# Altium footprint library TH Connectors.PcbLib: 140 footprints (part 4 of 9)
Each footprint in its own frame and in the unit in brackets; x right, y up, seen from the top. Pads: shape width x height; smd on the part's side, far side on the other; paste and mask are expansions set on the pad; w line width, h text height; cw(c..) or ccw(c..) is an arc to the next point about the centre after c.
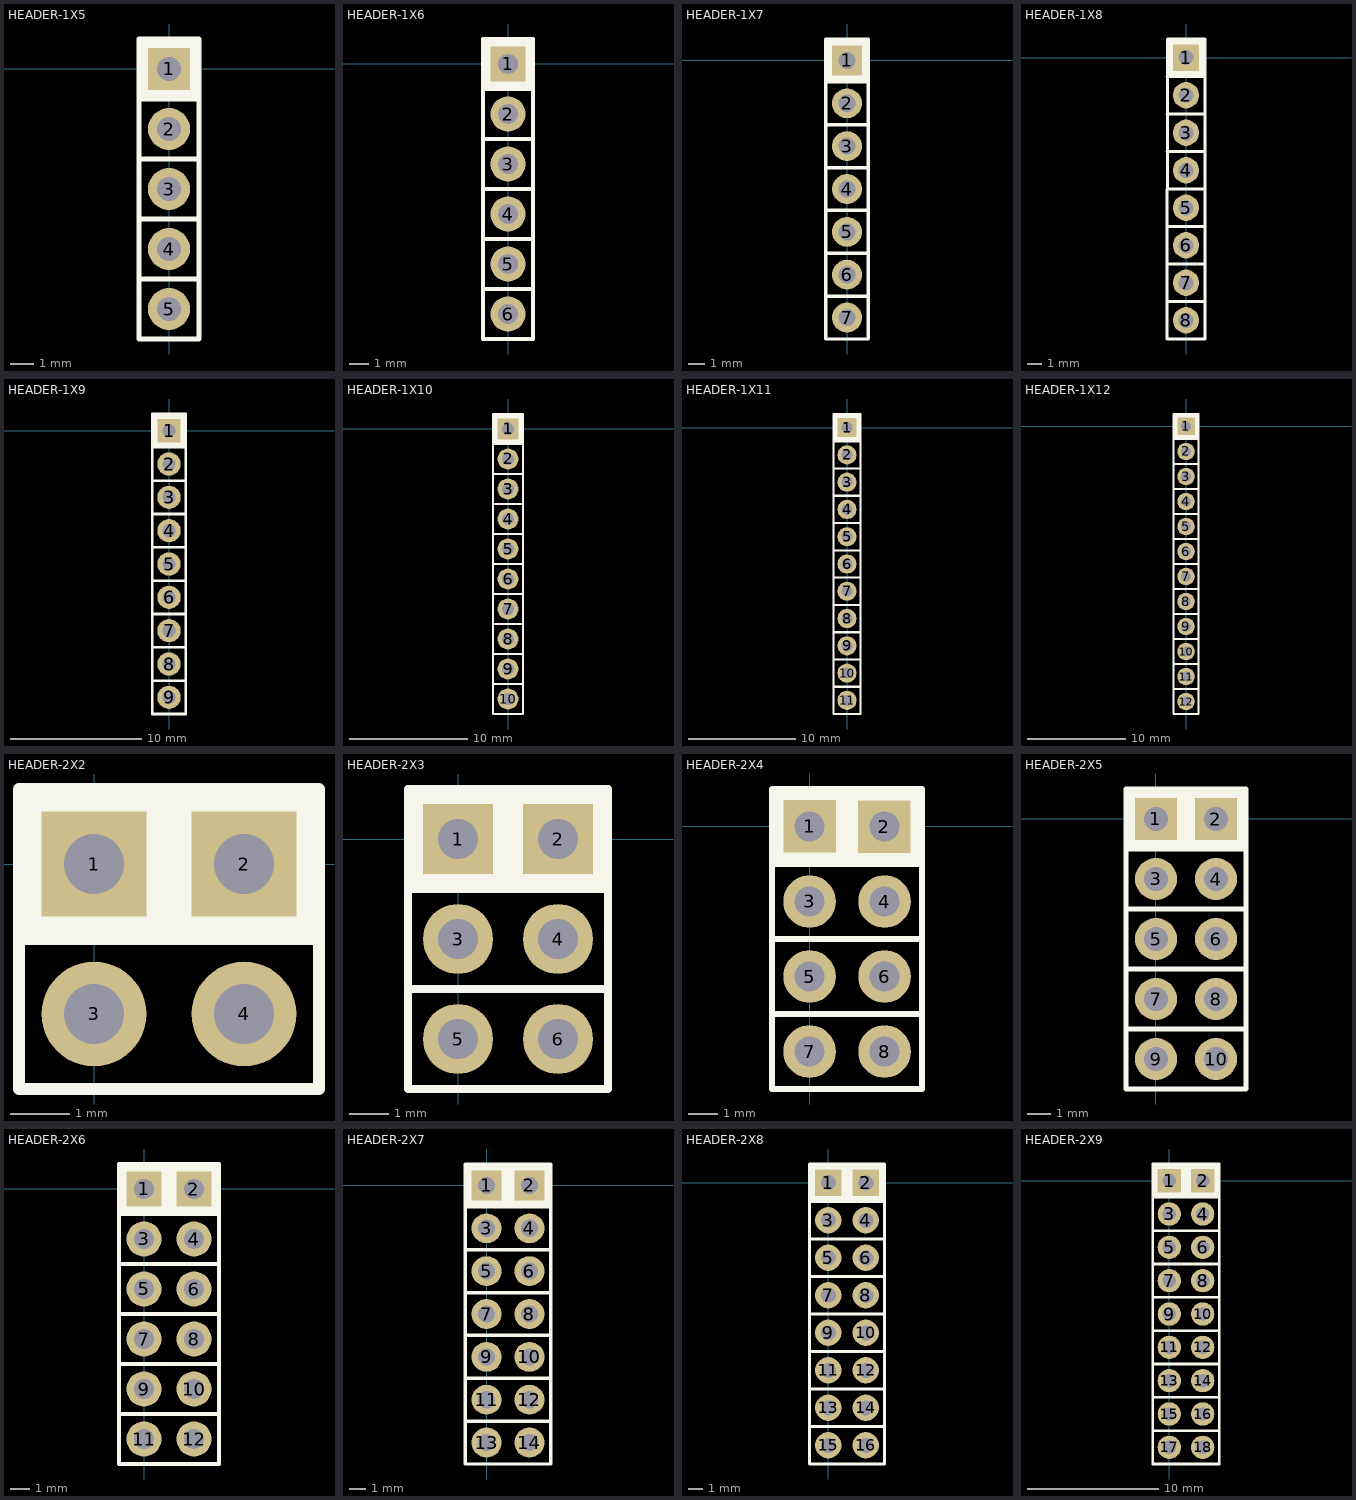
[diagram p3: the footprints below, top view; thin cyan lines are the x and y axes]

## HEADER-1X5 [mil]
pads (5):
  rect 70x70 hole 40: 1(0,0)
  round 70 hole 40: 2(0,-100) 3(0,-200) 4(0,-300) 5(0,-400)
Top Overlay:
  rectangle: -50,-49.62 50,50
  lines w8: -50,-350 50,-350 ; -50,-250 50,-250 ; -50,-150 50,-150 ; -50,-50 50,-50 ; -50,-450 -50,50 50,50 50,-450 -50,-450
3D body: height 470, standoff -120, extent -15,-215 15,-185
3D body: height 100, standoff 0, extent -50,-450 50,50
3D body: height 470, standoff -120, extent -15,-115 15,-85
3D body: height 470, standoff -120, extent -15,-15 15,15
3D body: height 470, standoff -120, extent -15,-315 15,-285
3D body: height 470, standoff -120, extent -15,-415 15,-385
3D body: height 101, standoff 100, extent -35,-35 35.5,35

## HEADER-1X6 [mil]
pads (6):
  rect 70x70 hole 40: 1(0,0)
  round 70 hole 40: 2(0,-100) 3(0,-200) 4(0,-300) 5(0,-400) 6(0,-500)
Top Overlay:
  rectangle: -50,-49.62 50,50
  lines w8: -50,-250 50,-250 ; -50,-150 50,-150 ; -50,-50 50,-50 ; -50,-550 50,-550 ; -50,-550 -50,50 50,50 50,-550 ; -50,-550 50,-550 ; -50,-550 50,-550 ; -50,-450 50,-450 -50,-450 ; -50,-350 50,-350 -50,-350
3D body: height 470, standoff -120, extent -15,-215 15,-185
3D body: height 100, standoff 0, extent -50,-550 50,50
3D body: height 470, standoff -120, extent -15,-115 15,-85
3D body: height 470, standoff -120, extent -15,-15 15,15
3D body: height 470, standoff -120, extent -15,-315 15,-285
3D body: height 470, standoff -120, extent -15,-415 15,-385
3D body: height 470, standoff -120, extent -15,-515 15,-485
3D body: height 101, standoff 100, extent -35,-35 35.5,35

## HEADER-1X7 [mil]
pads (7):
  rect 70x70 hole 40: 1(0,0)
  round 70 hole 40: 2(0,-100) 3(0,-200) 4(0,-300) 5(0,-400) 6(0,-500) 7(0,-600)
Top Overlay:
  rectangle: -50,-49.62 50,50
  lines w8: -50,-250 50,-250 ; -50,-150 50,-150 ; -50,-50 50,-50 ; -50,-650 50,-650 ; -50,-650 -50,50 50,50 50,-650 ; -50,-650 50,-650 ; -50,-650 50,-650 ; -50,-550 50,-550 -50,-550 ; -50,-450 50,-450 -50,-450 ; -50,-350 50,-350 -50,-350
3D body: height 470, standoff -120, extent -15,-215 15,-185
3D body: height 100, standoff 0, extent -50,-650 50,50
3D body: height 470, standoff -120, extent -15,-115 15,-85
3D body: height 470, standoff -120, extent -15,-15 15,15
3D body: height 470, standoff -120, extent -15,-315 15,-285
3D body: height 470, standoff -120, extent -15,-415 15,-385
3D body: height 470, standoff -120, extent -15,-515 15,-485
3D body: height 470, standoff -120, extent -15,-615 15,-585
3D body: height 101, standoff 100, extent -35,-35 35.5,35

## HEADER-1X8 [mil]
pads (8):
  rect 70x70 hole 40: 1(0,0)
  round 70 hole 40: 2(0,-100) 3(0,-200) 4(0,-300) 5(0,-400) 6(0,-500) 7(0,-600) 8(0,-700)
Top Overlay:
  rectangle: -50,-49.62 50,50
  lines w8: -50,-250 50,-250 ; -50,-150 50,-150 ; -50,-50 50,-50 ; -50,-750 50,-750 ; -50,-750 -50,50 50,50 50,-750 ; -50,-750 50,-750 ; -50,-750 50,-750 ; -50,-650 50,-650 -50,-650 ; -50,-550 50,-550 -50,-550 ; -50,-450 50,-450 -50,-450 ; -50,-350 50,-350 -50,-350
3D body: height 470, standoff -120, extent -15,-215 15,-185
3D body: height 100, standoff 0, extent -50,-750 50,50
3D body: height 470, standoff -120, extent -15,-115 15,-85
3D body: height 470, standoff -120, extent -15,-15 15,15
3D body: height 470, standoff -120, extent -15,-315 15,-285
3D body: height 470, standoff -120, extent -15,-415 15,-385
3D body: height 470, standoff -120, extent -15,-515 15,-485
3D body: height 470, standoff -120, extent -15,-615 15,-585
3D body: height 470, standoff -120, extent -15,-715 15,-685
3D body: height 101, standoff 100, extent -35,-35 35.5,35

## HEADER-1X9 [mil]
pads (9):
  rect 70x70 hole 40: 1(0,0)
  round 70 hole 40: 2(0,-100) 3(0,-200) 4(0,-300) 5(0,-400) 6(0,-500) 7(0,-600) 8(0,-700) 9(0,-800)
Top Overlay:
  rectangle: -50,-49.62 50,50
  lines w8: -50,-250 50,-250 ; -50,-150 50,-150 ; -50,-50 50,-50 ; -50,-850 -50,50 50,50 50,-850 ; -50,-850 50,-850 ; -50,-850 50,-850 ; -50,-850 50,-850 ; -50,-750 50,-750 -50,-750 ; -50,-650 50,-650 -50,-650 ; -50,-550 50,-550 -50,-550 ; -50,-450 50,-450 -50,-450 ; -50,-350 50,-350 -50,-350
3D body: height 101, standoff 100, extent -35,-35 35.5,35
3D body: height 470, standoff -120, extent -15,-815 15,-785
3D body: height 470, standoff -120, extent -15,-715 15,-685
3D body: height 470, standoff -120, extent -15,-615 15,-585
3D body: height 470, standoff -120, extent -15,-515 15,-485
3D body: height 470, standoff -120, extent -15,-415 15,-385
3D body: height 470, standoff -120, extent -15,-315 15,-285
3D body: height 470, standoff -120, extent -15,-15 15,15
3D body: height 470, standoff -120, extent -15,-115 15,-85
3D body: height 100, standoff 0, extent -50,-850 50,50
3D body: height 470, standoff -120, extent -15,-215 15,-185

## HEADER-1X10 [mil]
pads (10):
  rect 70x70 hole 40: 1(0,0)
  round 70 hole 40: 2(0,-100) 3(0,-200) 4(0,-300) 5(0,-400) 6(0,-500) 7(0,-600) 8(0,-700) 9(0,-800) 10(0,-900)
Top Overlay:
  rectangle: -50,-49.62 50,50
  lines w8: -50,-250 50,-250 ; -50,-150 50,-150 ; -50,-50 50,-50 ; -50,-950 50,-950 ; -50,-950 -50,50 50,50 50,-950 ; -50,-950 50,-950 ; -50,-950 50,-950 ; -50,-850 50,-850 -50,-850 ; -50,-750 50,-750 -50,-750 ; -50,-650 50,-650 -50,-650 ; -50,-550 50,-550 -50,-550 ; -50,-450 50,-450 -50,-450 ; -50,-350 50,-350 -50,-350
3D body: height 470, standoff -120, extent -15,-215 15,-185
3D body: height 100, standoff 0, extent -50,-950 50,50
3D body: height 470, standoff -120, extent -15,-115 15,-85
3D body: height 470, standoff -120, extent -15,-15 15,15
3D body: height 470, standoff -120, extent -15,-315 15,-285
3D body: height 470, standoff -120, extent -15,-415 15,-385
3D body: height 470, standoff -120, extent -15,-515 15,-485
3D body: height 470, standoff -120, extent -15,-615 15,-585
3D body: height 470, standoff -120, extent -15,-715 15,-685
3D body: height 470, standoff -120, extent -15,-815 15,-785
3D body: height 470, standoff -120, extent -15,-915 15,-885
3D body: height 101, standoff 100, extent -35,-35 35.5,35

## HEADER-1X11 [mil]
pads (11):
  rect 70x70 hole 40: 1(0,0)
  round 70 hole 40: 2(0,-100) 3(0,-200) 4(0,-300) 5(0,-400) 6(0,-500) 7(0,-600) 8(0,-700) 9(0,-800) 10(0,-900) 11(0,-1000)
Top Overlay:
  rectangle: -50,-49.62 50,50
  lines w8: -50,-250 50,-250 ; -50,-150 50,-150 ; -50,-50 50,-50 ; -50,-1050 -50,50 50,50 50,-1050 ; -50,-1050 50,-1050 ; -50,-1050 50,-1050 ; -50,-1050 50,-1050 ; -50,-1050 50,-1050 ; -50,-950 50,-950 -50,-950 ; -50,-850 50,-850 -50,-850 ; -50,-750 50,-750 -50,-750 ; -50,-650 50,-650 -50,-650 ; -50,-550 50,-550 -50,-550 ; -50,-450 50,-450 -50,-450 ; -50,-350 50,-350 -50,-350
3D body: height 101, standoff 100, extent -35,-35 35.5,35
3D body: height 470, standoff -120, extent -15,-915 15,-885
3D body: height 470, standoff -120, extent -15,-815 15,-785
3D body: height 470, standoff -120, extent -15,-715 15,-685
3D body: height 470, standoff -120, extent -15,-615 15,-585
3D body: height 470, standoff -120, extent -15,-515 15,-485
3D body: height 470, standoff -120, extent -15,-415 15,-385
3D body: height 470, standoff -120, extent -15,-315 15,-285
3D body: height 470, standoff -120, extent -15,-15 15,15
3D body: height 470, standoff -120, extent -15,-115 15,-85
3D body: height 100, standoff 0, extent -50,-1050 50,50
3D body: height 470, standoff -120, extent -15,-215 15,-185
3D body: height 470, standoff -120, extent -15,-1015 15,-985

## HEADER-1X12 [mil]
pads (12):
  rect 70x70 hole 40: 1(0,0)
  round 70 hole 40: 2(0,-100) 3(0,-200) 4(0,-300) 5(0,-400) 6(0,-500) 7(0,-600) 8(0,-700) 9(0,-800) 10(0,-900) 11(0,-1000) 12(0,-1100)
Top Overlay:
  rectangle: -50,-49.62 50,50
  lines w8: -50,-950 50,-950 ; -50,-250 50,-250 ; -50,-150 50,-150 ; -50,-50 50,-50 ; -50,-1150 50,-1150 ; -50,-1150 50,-1150 ; -50,-1150 50,-1150 ; -50,-1150 50,-1150 ; -50,-1150 -50,50 50,50 50,-1150 ; -50,-1050 50,-1050 ; -50,-1050 50,-1050 ; -50,-1050 50,-1050 ; -50,-850 50,-850 -50,-850 ; -50,-750 50,-750 -50,-750 ; -50,-650 50,-650 -50,-650 ; -50,-550 50,-550 -50,-550 ; -50,-450 50,-450 -50,-450 ; -50,-350 50,-350 -50,-350
3D body: height 470, standoff -120, extent -15,-1115 15,-1085
3D body: height 470, standoff -120, extent -15,-1015 15,-985
3D body: height 101, standoff 100, extent -35,-35 35.5,35
3D body: height 470, standoff -120, extent -15,-915 15,-885
3D body: height 470, standoff -120, extent -15,-815 15,-785
3D body: height 470, standoff -120, extent -15,-715 15,-685
3D body: height 470, standoff -120, extent -15,-615 15,-585
3D body: height 470, standoff -120, extent -15,-515 15,-485
3D body: height 470, standoff -120, extent -15,-415 15,-385
3D body: height 470, standoff -120, extent -15,-315 15,-285
3D body: height 470, standoff -120, extent -15,-15 15,15
3D body: height 470, standoff -120, extent -15,-115 15,-85
3D body: height 100, standoff 0, extent -50,-1150 50,50
3D body: height 470, standoff -120, extent -15,-215 15,-185

## HEADER-2X2 [mil]
pads (4):
  rect 70x70 hole 40: 1(0,0) 2(100,0)
  round 70 hole 40: 3(0,-100) 4(100,-100)
Top Overlay:
  rectangle: 50,-49.62 150,50
  rectangle: -50,-49.62 50,50
  lines w8: -50,-50 50,-50 150,-50 ; -50,-150 50,-150 150,-150 150,50 50,50 -50,50 -50,-150
3D body: height 470, standoff -120, extent 85,-115 115,-85
3D body: height 470, standoff -120, extent 85,-15 115,15
3D body: height 101, standoff 100, extent 65,-35 135.5,35
3D body: height 101, standoff 100, extent -35,-35 35.5,35
3D body: height 470, standoff -120, extent -15,-15 15,15
3D body: height 470, standoff -120, extent -15,-115 15,-85
3D body: height 100, standoff 0, extent -50,-150 150,50

## HEADER-2X3 [mil]
pads (6):
  rect 70x70 hole 40: 1(0,0) 2(100,0)
  round 70 hole 40: 3(0,-100) 4(100,-100) 5(0,-200) 6(100,-200)
Top Overlay:
  rectangle: 50,-49.62 150,50
  rectangle: -50,-49.62 50,50
  lines w8: -50,-150 50,-150 150,-150 ; -50,-50 50,-50 150,-50 ; -50,-250 50,-250 ; -50,-250 50,-250 ; -50,-250 -50,50 50,50 150,50 150,-250 ; 50,-250 150,-250 ; 50,-250 150,-250
3D body: height 470, standoff -120, extent 85,-215 115,-185
3D body: height 100, standoff 0, extent 50,-250 150,50
3D body: height 470, standoff -120, extent 85,-115 115,-85
3D body: height 470, standoff -120, extent 85,-15 115,15
3D body: height 101, standoff 100, extent 65,-35 135.5,35
3D body: height 101, standoff 100, extent -35,-35 35.5,35
3D body: height 470, standoff -120, extent -15,-15 15,15
3D body: height 470, standoff -120, extent -15,-115 15,-85
3D body: height 100, standoff 0, extent -50,-250 50,50
3D body: height 470, standoff -120, extent -15,-215 15,-185

## HEADER-2X4 [mil]
pads (8):
  rect 70x70 hole 40: 1(0,0) 2(100,0)
  round 70 hole 40: 3(0,-100) 4(100,-100) 5(0,-200) 6(100,-200) 7(0,-300) 8(100,-300)
Top Overlay:
  rectangle: -50,-49.62 50,50
  rectangle: 50,-49.62 150,50
  lines w8: -50,-250 50,-250 150,-250 ; -50,-150 50,-150 150,-150 ; -50,-50 50,-50 150,-50 ; -50,-350 -50,50 50,50 150,50 150,-350 ; -50,-350 50,-350 ; -50,-350 50,-350 ; 50,-350 150,-350 ; 50,-350 150,-350
3D body: height 470, standoff -120, extent -15,-215 15,-185
3D body: height 100, standoff 0, extent -50,-350 150,50
3D body: height 470, standoff -120, extent -15,-115 15,-85
3D body: height 470, standoff -120, extent -15,-15 15,15
3D body: height 470, standoff -120, extent -15,-315 15,-285
3D body: height 101, standoff 100, extent -35,-35 35.5,35
3D body: height 101, standoff 100, extent 65,-35 135.5,35
3D body: height 470, standoff -120, extent 85,-315 115,-285
3D body: height 470, standoff -120, extent 85,-15 115,15
3D body: height 470, standoff -120, extent 85,-115 115,-85
3D body: height 470, standoff -120, extent 85,-215 115,-185

## HEADER-2X5 [mil]
pads (10):
  rect 70x70 hole 40: 1(0,0) 2(100,0)
  round 70 hole 40: 3(0,-100) 4(100,-100) 5(0,-200) 6(100,-200) 7(0,-300) 8(100,-300) 9(0,-400) 10(100,-400)
Top Overlay:
  rectangle: 50,-49.62 150,50
  rectangle: -50,-49.62 50,50
  lines w8: -50,-250 50,-250 150,-250 ; -50,-150 50,-150 150,-150 ; -50,-50 50,-50 150,-50 ; -50,-450 50,-450 ; -50,-450 50,-450 ; -50,-450 -50,50 50,50 150,50 150,-450 ; 50,-450 150,-450 ; 50,-450 150,-450 ; 50,-350 150,-350 50,-350 ; 50,-350 -50,-350 50,-350
3D body: height 470, standoff -120, extent 85,-215 115,-185
3D body: height 470, standoff -120, extent 85,-115 115,-85
3D body: height 470, standoff -120, extent 85,-15 115,15
3D body: height 470, standoff -120, extent 85,-315 115,-285
3D body: height 470, standoff -120, extent 85,-415 115,-385
3D body: height 101, standoff 100, extent 65,-35 135.5,35
3D body: height 101, standoff 100, extent -35,-35 35.5,35
3D body: height 470, standoff -120, extent -15,-415 15,-385
3D body: height 470, standoff -120, extent -15,-315 15,-285
3D body: height 470, standoff -120, extent -15,-15 15,15
3D body: height 470, standoff -120, extent -15,-115 15,-85
3D body: height 100, standoff 0, extent -50,-450 150,50
3D body: height 470, standoff -120, extent -15,-215 15,-185

## HEADER-2X6 [mil]
pads (12):
  rect 70x70 hole 40: 1(0,0) 2(100,0)
  round 70 hole 40: 3(0,-100) 4(100,-100) 5(0,-200) 6(100,-200) 7(0,-300) 8(100,-300) 9(0,-400) 10(100,-400) 11(0,-500) 12(100,-500)
Top Overlay:
  rectangle: -50,-49.62 50,50
  rectangle: 50,-49.62 150,50
  lines w8: -50,-250 50,-250 150,-250 ; -50,-150 50,-150 150,-150 ; -50,-50 50,-50 150,-50 ; -50,-550 -50,50 50,50 150,50 150,-550 ; -50,-550 50,-550 ; -50,-550 50,-550 ; 50,-550 150,-550 ; 50,-550 150,-550 ; 50,-450 -50,-450 50,-450 ; 50,-450 150,-450 50,-450 ; 50,-350 -50,-350 50,-350 ; 50,-350 150,-350 50,-350
3D body: height 470, standoff -120, extent -15,-215 15,-185
3D body: height 100, standoff 0, extent -50,-550 150,50
3D body: height 470, standoff -120, extent -15,-115 15,-85
3D body: height 470, standoff -120, extent -15,-15 15,15
3D body: height 470, standoff -120, extent -15,-315 15,-285
3D body: height 470, standoff -120, extent -15,-415 15,-385
3D body: height 470, standoff -120, extent -15,-515 15,-485
3D body: height 101, standoff 100, extent -35,-35 35.5,35
3D body: height 101, standoff 100, extent 65,-35 135.5,35
3D body: height 470, standoff -120, extent 85,-515 115,-485
3D body: height 470, standoff -120, extent 85,-415 115,-385
3D body: height 470, standoff -120, extent 85,-315 115,-285
3D body: height 470, standoff -120, extent 85,-15 115,15
3D body: height 470, standoff -120, extent 85,-115 115,-85
3D body: height 470, standoff -120, extent 85,-215 115,-185

## HEADER-2X7 [mil]
pads (14):
  rect 70x70 hole 40: 1(0,0) 2(100,0)
  round 70 hole 40: 3(0,-100) 4(100,-100) 5(0,-200) 6(100,-200) 7(0,-300) 8(100,-300) 9(0,-400) 10(100,-400) 11(0,-500) 12(100,-500) 13(0,-600) 14(100,-600)
Top Overlay:
  rectangle: 50,-49.62 150,50
  rectangle: -50,-49.62 50,50
  lines w8: -50,-250 50,-250 150,-250 ; -50,-150 50,-150 150,-150 ; -50,-50 50,-50 150,-50 ; -50,-650 50,-650 ; -50,-650 50,-650 ; -50,-650 -50,50 50,50 150,50 150,-650 ; 50,-650 150,-650 ; 50,-650 150,-650 ; 50,-550 150,-550 50,-550 ; 50,-550 -50,-550 50,-550 ; 50,-450 150,-450 50,-450 ; 50,-450 -50,-450 50,-450 ; 50,-350 150,-350 50,-350 ; 50,-350 -50,-350 50,-350
3D body: height 470, standoff -120, extent 85,-215 115,-185
3D body: height 470, standoff -120, extent 85,-115 115,-85
3D body: height 470, standoff -120, extent 85,-15 115,15
3D body: height 470, standoff -120, extent 85,-315 115,-285
3D body: height 470, standoff -120, extent 85,-415 115,-385
3D body: height 470, standoff -120, extent 85,-515 115,-485
3D body: height 470, standoff -120, extent 85,-615 115,-585
3D body: height 101, standoff 100, extent 65,-35 135.5,35
3D body: height 101, standoff 100, extent -35,-35 35.5,35
3D body: height 470, standoff -120, extent -15,-615 15,-585
3D body: height 470, standoff -120, extent -15,-515 15,-485
3D body: height 470, standoff -120, extent -15,-415 15,-385
3D body: height 470, standoff -120, extent -15,-315 15,-285
3D body: height 470, standoff -120, extent -15,-15 15,15
3D body: height 470, standoff -120, extent -15,-115 15,-85
3D body: height 100, standoff 0, extent -50,-650 150,50
3D body: height 470, standoff -120, extent -15,-215 15,-185

## HEADER-2X8 [mil]
pads (16):
  rect 70x70 hole 40: 1(0,0) 2(100,0)
  round 70 hole 40: 3(0,-100) 4(100,-100) 5(0,-200) 6(100,-200) 7(0,-300) 8(100,-300) 9(0,-400) 10(100,-400) 11(0,-500) 12(100,-500) 13(0,-600) 14(100,-600) 15(0,-700) 16(100,-700)
Top Overlay:
  rectangle: 50,-49.62 150,50
  rectangle: -50,-49.62 50,50
  lines w8: -50,-250 50,-250 150,-250 ; -50,-150 50,-150 150,-150 ; -50,-50 50,-50 150,-50 ; -50,-750 50,-750 ; -50,-750 50,-750 ; -50,-750 -50,50 50,50 150,50 150,-750 ; 50,-750 150,-750 ; 50,-750 150,-750 ; 50,-650 150,-650 50,-650 ; 50,-650 -50,-650 50,-650 ; 50,-550 150,-550 50,-550 ; 50,-550 -50,-550 50,-550 ; 50,-450 150,-450 50,-450 ; 50,-450 -50,-450 50,-450 ; 50,-350 150,-350 50,-350 ; 50,-350 -50,-350 50,-350
3D body: height 470, standoff -120, extent 85,-215 115,-185
3D body: height 470, standoff -120, extent 85,-115 115,-85
3D body: height 470, standoff -120, extent 85,-15 115,15
3D body: height 470, standoff -120, extent 85,-315 115,-285
3D body: height 470, standoff -120, extent 85,-415 115,-385
3D body: height 470, standoff -120, extent 85,-515 115,-485
3D body: height 470, standoff -120, extent 85,-615 115,-585
3D body: height 470, standoff -120, extent 85,-715 115,-685
3D body: height 101, standoff 100, extent 65,-35 135.5,35
3D body: height 101, standoff 100, extent -35,-35 35.5,35
3D body: height 470, standoff -120, extent -15,-715 15,-685
3D body: height 470, standoff -120, extent -15,-615 15,-585
3D body: height 470, standoff -120, extent -15,-515 15,-485
3D body: height 470, standoff -120, extent -15,-415 15,-385
3D body: height 470, standoff -120, extent -15,-315 15,-285
3D body: height 470, standoff -120, extent -15,-15 15,15
3D body: height 470, standoff -120, extent -15,-115 15,-85
3D body: height 100, standoff 0, extent -50,-750 150,50
3D body: height 470, standoff -120, extent -15,-215 15,-185

## HEADER-2X9 [mil]
pads (18):
  rect 70x70 hole 40: 1(0,0) 2(100,0)
  round 70 hole 40: 3(0,-100) 4(100,-100) 5(0,-200) 6(100,-200) 7(0,-300) 8(100,-300) 9(0,-400) 10(100,-400) 11(0,-500) 12(100,-500) 13(0,-600) 14(100,-600) 15(0,-700) 16(100,-700) 17(0,-800) 18(100,-800)
Top Overlay:
  rectangle: 50,-49.62 150,50
  rectangle: -50,-49.62 50,50
  lines w8: -50,-250 50,-250 150,-250 ; -50,-150 50,-150 150,-150 ; -50,-50 50,-50 150,-50 ; -50,-850 50,-850 ; -50,-850 50,-850 ; -50,-850 -50,50 50,50 150,50 150,-850 ; 50,-850 150,-850 ; 50,-850 150,-850 ; 50,-750 150,-750 50,-750 ; 50,-750 -50,-750 50,-750 ; 50,-650 150,-650 50,-650 ; 50,-650 -50,-650 50,-650 ; 50,-550 150,-550 50,-550 ; 50,-550 -50,-550 50,-550 ; 50,-450 150,-450 50,-450 ; 50,-450 -50,-450 50,-450 ; 50,-350 150,-350 50,-350 ; 50,-350 -50,-350 50,-350
3D body: height 470, standoff -120, extent 85,-215 115,-185
3D body: height 470, standoff -120, extent 85,-115 115,-85
3D body: height 470, standoff -120, extent 85,-15 115,15
3D body: height 470, standoff -120, extent 85,-315 115,-285
3D body: height 470, standoff -120, extent 85,-415 115,-385
3D body: height 470, standoff -120, extent 85,-515 115,-485
3D body: height 470, standoff -120, extent 85,-615 115,-585
3D body: height 470, standoff -120, extent 85,-715 115,-685
3D body: height 470, standoff -120, extent 85,-815 115,-785
3D body: height 101, standoff 100, extent 65,-35 135.5,35
3D body: height 101, standoff 100, extent -35,-35 35.5,35
3D body: height 470, standoff -120, extent -15,-815 15,-785
3D body: height 470, standoff -120, extent -15,-715 15,-685
3D body: height 470, standoff -120, extent -15,-615 15,-585
3D body: height 470, standoff -120, extent -15,-515 15,-485
3D body: height 470, standoff -120, extent -15,-415 15,-385
3D body: height 470, standoff -120, extent -15,-315 15,-285
3D body: height 470, standoff -120, extent -15,-15 15,15
3D body: height 470, standoff -120, extent -15,-115 15,-85
3D body: height 100, standoff 0, extent -50,-850 150,50
3D body: height 470, standoff -120, extent -15,-215 15,-185